# Altium footprint library Nhan_Module.PcbLib: 43 footprints (part 1 of 3)
Each footprint in its own frame and in the unit in brackets; x right, y up, seen from the top. Pads: shape width x height; smd on the part's side, far side on the other; paste and mask are expansions set on the pad; w line width, h text height; cw(c..) or ccw(c..) is an arc to the next point about the centre after c.
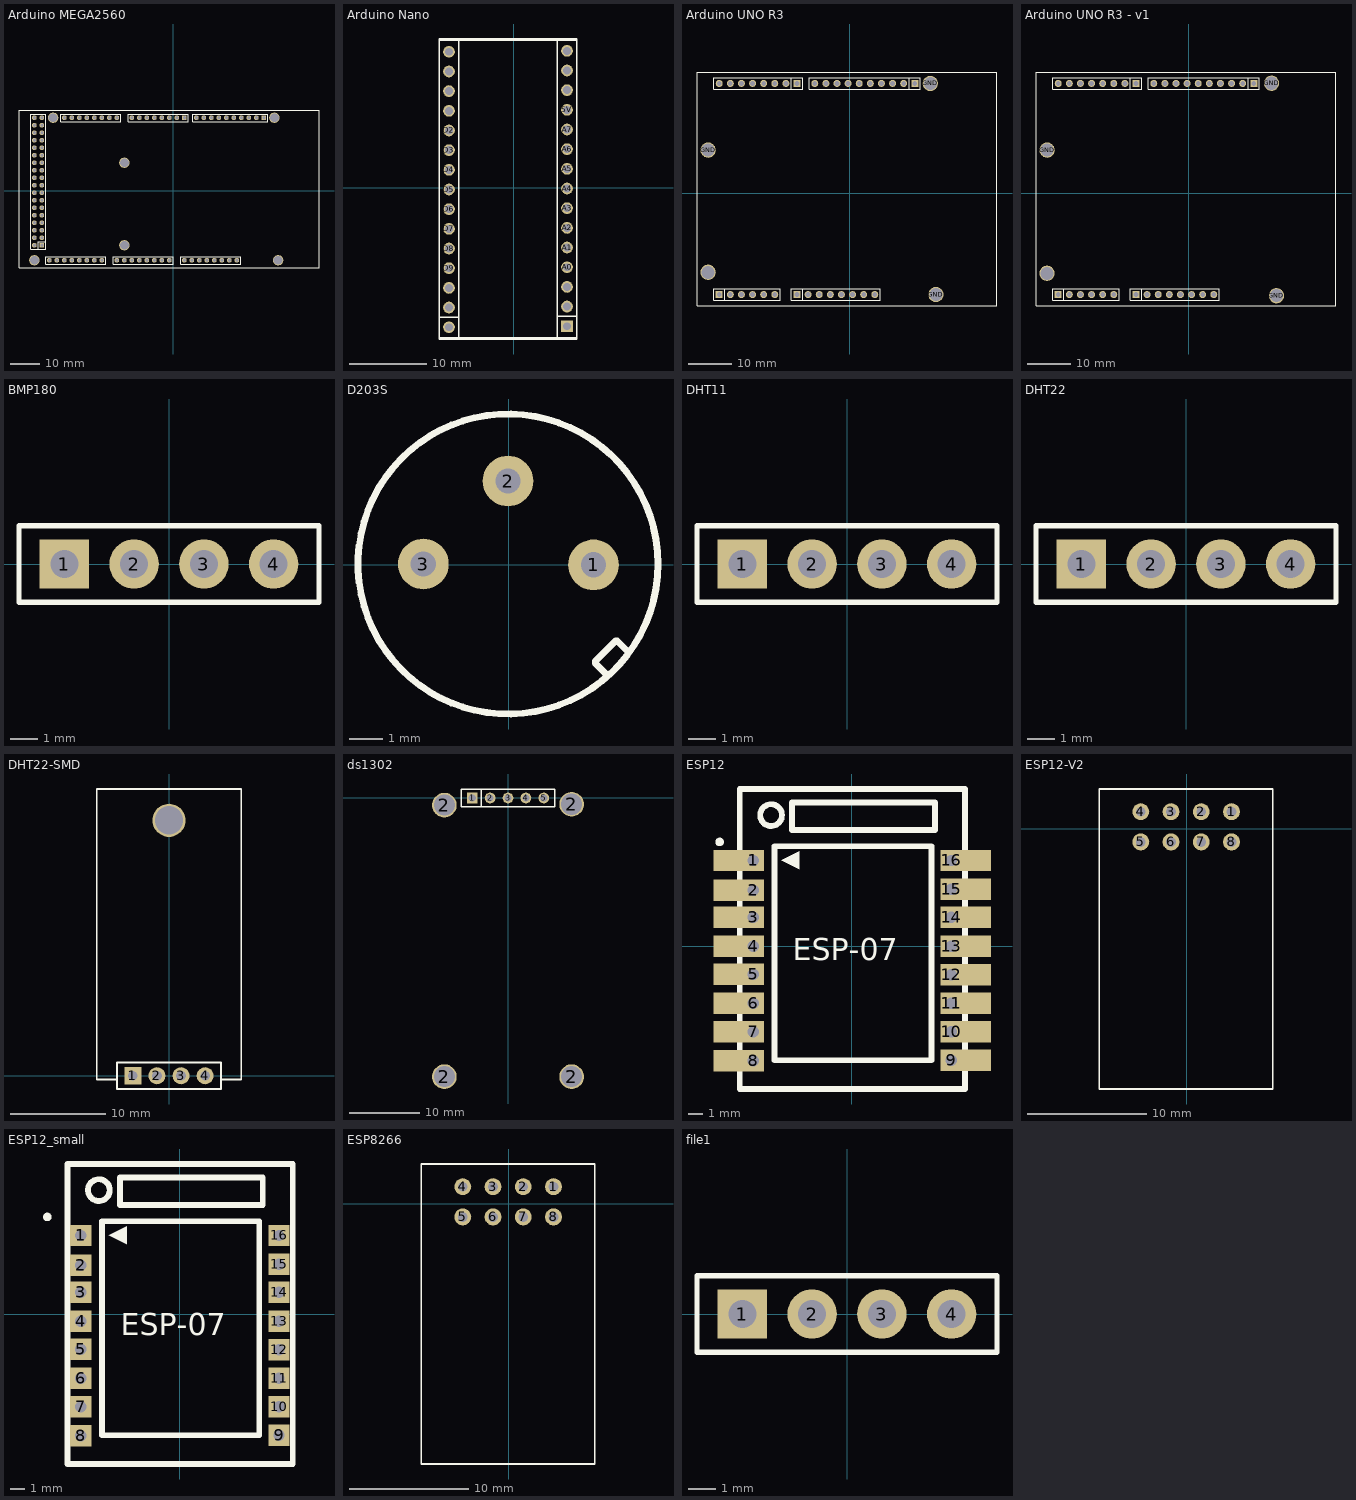
[diagram p0: the footprints below, top view; thin cyan lines are the x and y axes]

## Arduino MEGA2560 [mm]
height 8.5
pads (98):
  round 1.6 hole 1.1: 0-RX(-13.97,24.765) 1-TX(-11.43,24.765) 2(-8.89,24.765) 3V3(13.97,-23.495) 4(-3.81,24.765) 5V(-46.99,24.765) 5V(-44.45,24.765) 5V(11.43,-23.495) 8(7.874,24.765) 12(18.034,24.765) 13(20.574,24.765) 14(-19.05,24.765) 15(-21.59,24.765) 16(-24.13,24.765) 17(-26.67,24.765) 18(-29.21,24.765) 19(-31.75,24.765) 20(-34.29,24.765) 21(-36.83,24.765) 22(-44.45,22.225) 23(-46.99,22.225) 24(-44.45,19.685) 25(-46.99,19.685) 26(-44.45,17.145) 27(-46.99,17.145) 28(-44.45,14.605) 29(-46.99,14.605) 30(-44.45,12.065) 31(-46.99,12.065) 32(-44.45,9.525) 33(-46.99,9.525) 34(-44.45,6.985) 35(-46.99,6.985) 36(-44.45,4.445) 37(-46.99,4.445) 38(-44.45,1.905) 39(-46.99,1.905) 40(-44.45,-0.635) 41(-46.99,-0.635) 42(-44.45,-3.175) 43(-46.99,-3.175) 44(-44.45,-5.715) 45(-46.99,-5.715) 46(-44.45,-8.255) 47(-46.99,-8.255) 48(-44.45,-10.795) 49(-46.99,-10.795) 50(-44.45,-13.335) 51(-46.99,-13.335) 52(-44.45,-15.875) 53(-46.99,-15.875) A0(-1.27,-23.495) A1(-3.81,-23.495) A2(-6.35,-23.495) A3(-8.89,-23.495) A4(-11.43,-23.495) A5(-13.97,-23.495) A6(-16.51,-23.495) A7(-19.05,-23.495) A8(-24.13,-23.495) A9(-26.67,-23.495) A10(-29.21,-23.495) A11(-31.75,-23.495) A12(-34.29,-23.495) A13(-36.83,-23.495) A14(-39.37,-23.495) A15(-41.91,-23.495) AREF(25.654,24.765) GND(-46.99,-18.415) GND(6.35,-23.495) GND(8.89,-23.495) GND(23.114,24.765) IOREF(19.05,-23.495) RESET(16.51,-23.495) SDA(28.194,24.765) Vin(3.81,-23.495) ~3(-6.35,24.765) ~5(-1.27,24.765) ~6(1.27,24.765) ~9(10.414,24.765) ~10(12.954,24.765) ~11(15.494,24.765) ""(21.59,-23.495)
  rect 1.6x1.6 hole 1.1: 7(3.81,24.765) GND(-44.45,-18.415) SCL(30.734,24.765)
  round 3.5 hole 3: GND(-46.99,-23.495) GND(-40.64,24.765) GND(-16.51,-18.415) GND(-16.51,9.525) GND(34.29,24.765) GND(35.56,-23.495)
  round 0 all layers, no hole: ""(-46.99,-23.495) ""(-40.64,24.765) ""(-16.51,-18.415) ""(-16.51,9.525) ""(34.29,24.765) ""(35.56,-23.495)
Top Overlay:
  lines w0.2: -45.72,-19.685 -45.72,-17.145 -43.18,-17.145 ; -33.02,23.495 -17.78,23.495 ; -33.02,26.035 -17.78,26.035 ; -27.94,-24.765 -43.18,-24.765 ; -27.94,-22.225 -43.18,-22.225 ; -15.24,-24.765 0,-24.765 ; -15.24,-22.225 0,-22.225 ; -43.18,-24.765 -43.18,-22.225 ; -43.18,-24.765 -22.86,-24.765 -22.86,-22.225 -43.18,-22.225 ; -43.18,-24.765 -43.18,-22.225 ; -17.78,23.495 -17.78,26.035 ; -17.78,23.495 -38.1,23.495 -38.1,26.035 -17.78,26.035 ; -17.78,23.495 -17.78,26.035 ; 0,-24.765 0,-22.225 ; 0,-24.765 -20.32,-24.765 -20.32,-22.225 0,-22.225 ; 0,-24.765 0,-22.225 ; -52.197,-26.035 49.403,-26.035 49.403,18.796 49.403,27.305 -52.197,27.305 -52.197,24.511 -52.197,-26.035 ; -48.26,-19.685 -43.18,-19.685 -43.18,26.035 -48.26,26.035 -48.26,-19.685 ; -15.24,23.495 -15.24,26.035 5.08,26.035 5.08,23.495 -15.24,23.495 ; 2.54,-24.765 2.54,-22.225 22.86,-22.225 22.86,-24.765 2.54,-24.765 ; 6.604,23.495 30.099,23.495 32.004,23.495 32.004,26.035 6.604,26.035 6.604,23.495
3D body "61300811121.stp": height 8.54, standoff -3, extent -20.32,-24.765 0,-22.225
3D body "61300811121.stp": height 8.54, standoff -3, extent -15.24,23.495 5.08,26.035
3D body "61300811121.stp": height 8.54, standoff -3, extent 2.54,-24.765 22.86,-22.225
3D body "User Library-ARDUINO_MEGA_2560.STEP": height 15.2, standoff -0.05, extent -52.07,-26.035 55.88,27.305
3D body "61301011121.stp": height 8.54, standoff -3, extent 6.604,23.495 32.004,26.035
3D body "61300811121.stp": height 8.54, standoff -3, extent -43.18,-24.765 -22.86,-22.225
3D body "61300811121.stp": height 8.54, standoff -3, extent -38.1,23.495 -17.78,26.035
3D body "61303621121.stp": height 8.55, standoff -2.99, extent -48.26,-19.685 -43.18,26.035

## Arduino Nano [mm]
height 8.5
pads (30):
  round 1.52 hole 1.02: 3V3(6.858,-15.367) 5V(6.858,10.033) A0(6.858,-10.287) A1(6.858,-7.747) A2(6.858,-5.207) A3(6.858,-2.667) A4(6.858,-0.127) A5(6.858,2.413) A6(6.858,4.953) A7(6.858,7.493) D2(-8.382,7.366) D3(-8.382,4.826) D4(-8.382,2.286) D5(-8.382,-0.254) D6(-8.382,-2.794) D7(-8.382,-5.334) D8(-8.382,-7.874) D9(-8.382,-10.414) D10(-8.382,-12.954) D11(-8.382,-15.494) D12(-8.382,-18.034) GND(-8.382,9.906) GND(6.858,15.113) REF(6.858,-12.827) RST(-8.382,12.446) RST(6.858,12.573) RX0(-8.382,14.986) TX1(-8.382,17.526) VIN(6.858,17.653)
  rect 1.52x1.52 hole 1.02: D13(6.858,-17.907)
Top Overlay:
  lines w0.2: -9.652,-16.764 -7.112,-16.764 ; -9.652,-6.727 -9.652,-4.572 ; -9.652,-6.354 -9.652,-19.554 ; -9.652,-4.699 -9.652,19.046 -7.112,19.046 ; -9.652,18.288 -9.652,19.177 8.128,19.177 ; -8.128,-19.554 8.128,-19.554 8.128,-19.177 ; -7.112,-6.727 -7.112,19.05 8.128,19.05 8.128,19.177 ; -7.112,-6.354 -7.112,-19.554 -9.652,-19.554 ; 5.588,-16.637 8.128,-16.637 ; 5.588,-6.6 5.588,-4.445 ; 5.588,-6.227 5.588,-19.427 8.128,-19.427 8.128,-6.227 ; 5.588,-4.572 5.588,19.173 8.128,19.173 ; 6.096,-19.427 -9.652,-19.427 -9.652,-19.554 ; 8.128,-6.6 8.128,19.177
3D body "User Library-Nano-1.STEP": height 21.18, standoff 2.62, extent -9.652,-23.476 8.138,21.444
3D body "61301011821.stp": height 8.51, standoff -3.09, extent -9.632,-6.854 -7.132,19.046
3D body "61300511821.stp": height 8.51, standoff -3.09, extent -9.632,-19.554 -7.132,-6.354
3D body "61300511821.stp": height 8.51, standoff -3.09, extent 5.608,-19.427 8.108,-6.227
3D body "61301011821.stp": height 8.51, standoff -3.09, extent 5.608,-6.727 8.108,19.173

## Arduino UNO R3 [mm]
height 8.5
pads (40):
  round 1.6 hole 1.1: 0-RX(-29.845,25.146) 1-TX(-27.305,25.146) 2(-24.765,25.146) 3V3(-1.905,-23.114) 4(-19.685,25.146) 5V(-4.445,-23.114) 8(-8.001,25.146) 12(2.159,25.146) 13(4.699,25.146) A0(-17.145,-23.114) A1(-19.685,-23.114) A2(-22.225,-23.114) A3(-24.765,-23.114) A4(-27.305,-23.114) AREF(9.779,25.146) GND(-9.525,-23.114) GND(-6.985,-23.114) GND(7.239,25.146) IOREF(3.175,-23.114) NC(5.715,-23.114) RESET(0.635,-23.114) SDA(12.319,25.146) ~3(-22.225,25.146) ~5(-17.145,25.146) ~6(-14.605,25.146) ~9(-5.461,25.146) ~10(-2.921,25.146) ~11(-0.381,25.146)
  rect 1.6x1.6 hole 1.1: 7(-12.065,25.146) A5(-29.845,-23.114) SCL(14.859,25.146) Vin(-12.065,-23.114)
  round 3.5 hole 3: GND(-32.385,9.906) GND(18.415,25.146) GND(19.685,-23.114) ""(-32.385,-18.034)
  oval 0x2 all layers, no hole: ""(-32.385,-18.034)
  round 0 all layers, no hole: ""(-32.385,9.906) ""(18.415,25.146) ""(19.685,-23.114)
Top Overlay:
  lines w0.2: -28.575,-24.384 -28.575,-21.844 ; -13.335,23.876 -13.335,26.416 ; -10.795,-24.384 -10.795,-21.844 ; 13.589,23.876 13.589,26.416 ; -34.925,-25.654 33.655,-25.654 33.655,19.304 33.655,27.686 -34.925,27.686 -34.925,-8.255 -34.925,-25.654 ; -31.115,-24.384 -31.115,-21.844 -15.875,-21.844 -15.875,-24.384 -31.115,-24.384 ; -31.115,23.876 -31.115,26.416 -10.795,26.416 -10.795,23.876 -31.115,23.876 ; -13.335,-24.384 -13.335,-21.844 6.985,-21.844 6.985,-24.384 -13.335,-24.384 ; -9.271,23.876 14.224,23.876 16.129,23.876 16.129,26.416 -9.271,26.416 -9.271,23.876
3D body "61300811121.stp": height 8.54, standoff -3, extent -31.115,23.876 -10.795,26.416
3D body "61300811121.stp": height 8.54, standoff -3, extent -13.335,-24.384 6.985,-21.844
3D body "61300611121.stp": height 8.54, standoff -3, extent -31.115,-24.384 -15.875,-21.844
3D body "User Library-ARDUINO_UNO_R3_1.STEP": height 15.28, standoff 0.03, extent -34.925,-25.654 40.005,27.686
3D body "61301011121.stp": height 8.54, standoff -3, extent -9.271,23.876 16.129,26.416

## Arduino UNO R3 - v1 [mm]
height 8.5
pads (40):
  round 1.6 hole 1.1: 0-RX(-29.845,25.146) 1-TX(-27.305,25.146) 2(-24.765,25.146) 3V3(-1.905,-23.114) 4(-19.685,25.146) 5V(-4.445,-23.114) 8(-8.001,25.146) 12(2.159,25.146) 13(4.699,25.146) A0(-17.145,-23.114) A1(-19.685,-23.114) A2(-22.225,-23.114) A3(-24.765,-23.114) A4(-27.305,-23.114) AREF(9.779,25.146) GND(-9.525,-23.114) GND(-6.985,-23.114) GND(7.239,25.146) IOREF(3.175,-23.114) NC(5.715,-23.114) RESET(0.635,-23.114) SDA(12.319,25.146) ~3(-22.225,25.146) ~5(-17.145,25.146) ~6(-14.605,25.146) ~9(-5.461,25.146) ~10(-2.921,25.146) ~11(-0.381,25.146)
  rect 1.6x1.6 hole 1.1: 7(-12.065,25.146) A5(-29.845,-23.114) SCL(14.859,25.146) Vin(-12.065,-23.114)
  round 3.5 hole 3: GND(-32.385,9.906) GND(18.923,25.197) GND(20.041,-23.368) ""(-32.41,-18.263)
  oval 0x2 all layers, no hole: ""(-32.385,-18.034)
  round 0 all layers, no hole: ""(-32.385,9.906) ""(18.415,25.146) ""(19.685,-23.114)
Top Overlay:
  lines w0.2: -28.575,-24.384 -28.575,-21.844 ; -13.335,23.876 -13.335,26.416 ; -10.795,-24.384 -10.795,-21.844 ; 13.589,23.876 13.589,26.416 ; -34.925,-25.654 -34.925,-8.255 -34.925,27.686 33.655,27.686 33.655,19.304 33.655,-25.654 -34.925,-25.654 ; -31.115,-24.384 -15.875,-24.384 -15.875,-21.844 -31.115,-21.844 -31.115,-24.384 ; -31.115,23.876 -10.795,23.876 -10.795,26.416 -31.115,26.416 -31.115,23.876 ; -13.335,-24.384 6.985,-24.384 6.985,-21.844 -13.335,-21.844 -13.335,-24.384 ; -9.271,23.876 -9.271,26.416 16.129,26.416 16.129,23.876 14.224,23.876 -9.271,23.876
3D body "Carte Arduino UNO.STEP": height 14.98, standoff -0.12, extent -35.281,-25.79 40.627,27.61
3D body "61301011121.stp": height 8.54, standoff -3, extent -9.271,23.876 16.129,26.416
3D body "61300611121.stp": height 8.54, standoff -3, extent -31.115,-24.384 -15.875,-21.844
3D body "61300811121.stp": height 8.54, standoff -3, extent -13.335,-24.384 6.985,-21.844
3D body "61300811121.stp": height 8.54, standoff -3, extent -31.115,23.876 -10.795,26.416

## atzb s1 256 3.0 [mil]
height 334.65
3D body "User Library-ATZB-S1-256-3-0-C.STEP": height 151.79, standoff -26.93, extent -745.54,-440 435.54,347.4

## BMP180 [mm]
height 8.5
pads (4):
  rect 1.8x1.8 hole 1.02: 1(-3.81,0)
  round 1.8 hole 1.02: 2(-1.27,0) 3(1.27,0) 4(3.81,0)
Top Overlay:
  lines w0.2: -5.461,-1.397 5.461,-1.397 5.461,1.397 -5.461,1.397 -5.461,-1.397
3D body "BMP180_SHIELD_13x10.5.stp": height 20.5, standoff 3.2, extent -5.25,-0.508 5.25,7.132
3D body "61300411821.stp": height 8.51, standoff -3.09, extent -5.33,-1.25 5.33,1.25

## D203S [mil]
height 334.65
pads (3):
  round 60 hole 30: 1(100,0) 2(-1,99) 3(-101,1)
Top Overlay:
  circle w8: c-1,1 r177.17
  lines w8: 115,-129 102,-116 102,-114 126,-90 128,-90 141,-103
3D body "User Library-PIR_S_Orginal.step": height 187.01, standoff -76.77, extent -179.13,-179.09 179.13,179.14

## DHT11 [mm]
height 8.5
pads (4):
  rect 1.8x1.8 hole 1.02: 1(-3.81,0)
  round 1.8 hole 1.02: 2(-1.27,0) 3(1.27,0) 4(3.81,0)
Top Overlay:
  lines w0.2: -5.461,-1.397 5.461,-1.397 5.461,1.397 -5.461,1.397 -5.461,-1.397
3D body "61300411821.stp": height 8.51, standoff -3.09, extent -5.33,-1.25 5.33,1.25
3D body "User Library-DHT11-1.step": height 26, standoff 2, extent -6.477,-3 6.523,3

## DHT22 [mm]
height 8.5
pads (4):
  rect 1.8x1.8 hole 1.02: 1(-3.81,0)
  round 1.8 hole 1.02: 2(-1.27,0) 3(1.27,0) 4(3.81,0)
Top Overlay:
  lines w0.2: -5.461,-1.397 -5.461,1.397 5.461,1.397 5.461,-1.397 -5.461,-1.397
3D body "DHT22.SLDPRT": height 35.57, standoff 2.62, extent -7.862,-5.842 7.608,2.308
3D body "61300411821.stp": height 8.51, standoff -3.09, extent -5.33,-1.25 5.33,1.25

## DHT22-SMD [mm]
height 8.5
pads (5):
  rect 1.8x1.8 hole 1.02: 1(-3.81,0)
  round 1.8 hole 1.02: 2(-1.27,0) 3(1.27,0) 4(3.81,0)
  round 3.5 hole 3: ""(0,26.924)
Top Overlay:
  lines w0.2: -5.461,-0.381 -7.62,-0.381 -7.62,30.226 7.62,30.226 7.62,-0.381 5.461,-0.381 ; -5.461,-1.397 -5.461,1.397 5.461,1.397 5.461,-1.397 -5.461,-1.397
3D body "DHT22.stp": height 1.5, standoff -8.23, extent -7.55,-0.254 7.55,30.095

## ds1302 [mm]
height 8.5
pads (9):
  rect 1.52x1.52 hole 1.02: 1(-5.08,0)
  round 3.5 hole 3: 2(-9.017,-39.497) 2(-9.017,-1.016) 2(9.017,-39.497) 2(9.017,-0.889)
  round 1.52 hole 1.02: 2(-2.54,0) 3(0,0) 4(2.54,0) 5(5.08,0)
Top Overlay:
  lines w0.2: -3.81,-1.27 -3.81,1.27 ; -6.6,-1.27 -6.6,1.27 6.6,1.27 6.6,-1.27 -6.6,-1.27
3D body "REAL_TIME_SHEELD.stp": height 14, standoff 3.3, extent -11.5,-41.976 11.5,1.524
3D body "61300511821.stp": height 8.51, standoff -3.09, extent -6.6,-1.25 6.6,1.25

## ESP12 [mm]
pads (16):
  rect 3.54x1.5 hole 0.8 copper offset -1,0: 1(-6.91,6.007) 2(-6.91,3.924) 3(-6.91,2.019) 4(-6.91,-0.013) 5(-6.91,-1.968) 6(-6.91,-4) 7(-6.91,-5.982) 8(-6.91,-8.014)
  rect 3.54x1.5 hole 0.8 copper offset 1,0: 9(6.963,-7.988) 10(6.963,-5.982) 11(6.963,-4) 12(6.963,-1.994) 13(6.963,0.013) 14(6.963,2.019) 15(6.963,4) 16(6.963,6.007)
Top Overlay:
  circle w0.406: c-5.651,9.182 r0.762
  circle w0.3: c-9.257,7.304 r0.15
  region: -4.953,6.02 -3.683,5.385 -3.683,6.655
  lines w0.406: -7.849,-9.995 7.925,-9.995 7.925,11.011 -7.849,11.011 -7.849,-9.995 ; -5.423,-7.988 -5.423,6.998 5.575,6.998 5.575,-7.988 -5.423,-7.988 ; -4.178,8.141 -4.178,10.071 5.829,10.071 5.829,8.141 -4.178,8.141
  text "ESP-07" at -4.127,-0.978 h1.52
Mechanical 2:
Mechanical 4:
  text ">VALUE" at -8.395,-5.982 h0.04
  text ">VALUE" at -8.369,3.95 h0.04
  text ">VALUE" at -8.369,5.982 h0.04
  text ">VALUE" at -8.42,6.007 h0.04
  text ">VALUE" at -8.42,4 h0.04
  text ">VALUE" at -8.42,2.019 h0.04
  text ">VALUE" at -8.42,0.013 h0.04
  text ">VALUE" at -8.42,-1.994 h0.04
  text ">VALUE" at -8.42,-4 h0.04
  text ">VALUE" at -8.42,-5.982 h0.04
  text ">VALUE" at 8.572,-7.988 h0.04
  text ">VALUE" at 8.572,-5.982 h0.04
  text ">VALUE" at 8.572,-4 h0.04
  text ">VALUE" at 8.572,-1.994 h0.04
  text ">VALUE" at 8.572,0.013 h0.04
  text ">VALUE" at 8.572,2.019 h0.04
  text ">VALUE" at 8.572,4 h0.04
  text ">VALUE" at 8.572,6.007 h0.04
3D body "AI-THINKER_ESP-12.STEP": height 9, standoff 6.2, extent -7.874,-9.46 8.126,14.54
3D body "62000811121.stp": height 9, standoff 0.2, extent -7.985,-8.889 -5.985,7.111
3D body "62000811121.stp": height 9, standoff 0.2, extent 5.985,-9.016 7.985,6.984
3D body "62000811821.stp": height 4.31, standoff -2.39, extent -8.115,-9.139 -5.715,7.361
3D body "62000811821.stp": height 4.31, standoff -2.39, extent 5.728,-9.271 8.128,7.229

## ESP12-V2 [mil]
pads (8):
  round 56 hole 32: 1(148,57) 2(48,57) 3(-52,57) 4(-152,57) 5(-152,-43) 6(-52,-43) 7(48,-43) 8(148,-43)
Top Overlay:
  lines w5: -290,-860 285,-860 285,132 -290,132 -290,-860
3D body "Base PCB.stp": height 210.04, standoff -32.87, extent -202,-1693.2 698,326

## ESP12_small [mm]
pads (16):
  rect 1.5x1.5 hole 0.8: 1(-6.91,5.499) 2(-6.91,3.416) 3(-6.91,1.511) 4(-6.91,-0.521) 5(-6.91,-2.476) 6(-6.91,-4.508) 7(-6.91,-6.49) 8(-6.91,-8.522) 9(6.963,-8.496) 10(6.963,-6.49) 11(6.963,-4.508) 12(6.963,-2.502) 13(6.963,-0.495) 14(6.963,1.511) 15(6.963,3.492) 16(6.963,5.499)
Top Overlay:
  circle w0.3: c-9.257,6.796 r0.15
  circle w0.406: c-5.651,8.674 r0.762
  region: -4.953,5.512 -3.683,4.877 -3.683,6.147
  lines w0.406: -7.849,-10.503 -7.849,10.503 7.925,10.503 7.925,-10.503 -7.849,-10.503 ; -5.423,-8.496 5.575,-8.496 5.575,6.49 -5.423,6.49 -5.423,-8.496 ; -4.178,7.633 5.829,7.633 5.829,9.563 -4.178,9.563 -4.178,7.633
  text "ESP-07" at -4.127,-1.486 h1.52
Mechanical 2:
Mechanical 4:
  text ">VALUE" at 8.572,5.499 h0.04
  text ">VALUE" at 8.572,3.492 h0.04
  text ">VALUE" at 8.572,1.511 h0.04
  text ">VALUE" at 8.572,-0.495 h0.04
  text ">VALUE" at 8.572,-2.502 h0.04
  text ">VALUE" at 8.572,-4.508 h0.04
  text ">VALUE" at 8.572,-6.49 h0.04
  text ">VALUE" at 8.572,-8.496 h0.04
  text ">VALUE" at -8.42,-6.49 h0.04
  text ">VALUE" at -8.42,-4.508 h0.04
  text ">VALUE" at -8.42,-2.502 h0.04
  text ">VALUE" at -8.42,-0.495 h0.04
  text ">VALUE" at -8.42,1.511 h0.04
  text ">VALUE" at -8.42,3.492 h0.04
  text ">VALUE" at -8.42,5.499 h0.04
  text ">VALUE" at -8.369,5.474 h0.04
  text ">VALUE" at -8.369,3.442 h0.04
  text ">VALUE" at -8.395,-6.49 h0.04
3D body "62000811821.stp": height 4.31, standoff -2.39, extent 5.728,-9.779 8.128,6.721
3D body "62000811821.stp": height 4.31, standoff -2.39, extent -8.115,-9.647 -5.715,6.853
3D body "62000811121.stp": height 9, standoff 0.2, extent 5.985,-9.524 7.985,6.476
3D body "62000811121.stp": height 9, standoff 0.2, extent -7.985,-9.397 -5.985,6.603
3D body "AI-THINKER_ESP-12.STEP": height 9, standoff 6.2, extent -7.874,-9.968 8.126,14.032

## ESP8266 [mil]
pads (8):
  round 56 hole 32: 1(148,57) 2(48,57) 3(-52,57) 4(-152,57) 5(-152,-43) 6(-52,-43) 7(48,-43) 8(148,-43)
Top Overlay:
  lines w5: -290,-860 285,-860 285,132 -290,132 -290,-860
3D body "Wi07C.step": height 566.04, standoff 106.3, extent -290,-858.19 280.87,118.19
3D body "61300821821.stp": height 335.04, standoff -121.65, extent -209.84,-90 209.84,110

## file1 [mm]
height 8.5
pads (4):
  rect 1.8x1.8 hole 1.02: 1(-3.81,0)
  round 1.8 hole 1.02: 2(-1.27,0) 3(1.27,0) 4(3.81,0)
Top Overlay:
  lines w0.2: -5.461,-1.397 5.461,-1.397 5.461,1.397 -5.461,1.397 -5.461,-1.397
3D body "?????? ?????-????? 1.STEP": height 25.22, standoff -30.17, extent -21.674,3.275 18.626,11.025
3D body "61300411821.stp": height 8.51, standoff -3.09, extent -5.33,-1.25 5.33,1.25